# Altium footprint library Package_SO.PcbLib: 333 footprints (part 3 of 21)
Each footprint in its own frame and in the unit in brackets; x right, y up, seen from the top. Pads: shape width x height; smd on the part's side, far side on the other; paste and mask are expansions set on the pad; w line width, h text height; cw(c..) or ccw(c..) is an arc to the next point about the centre after c.
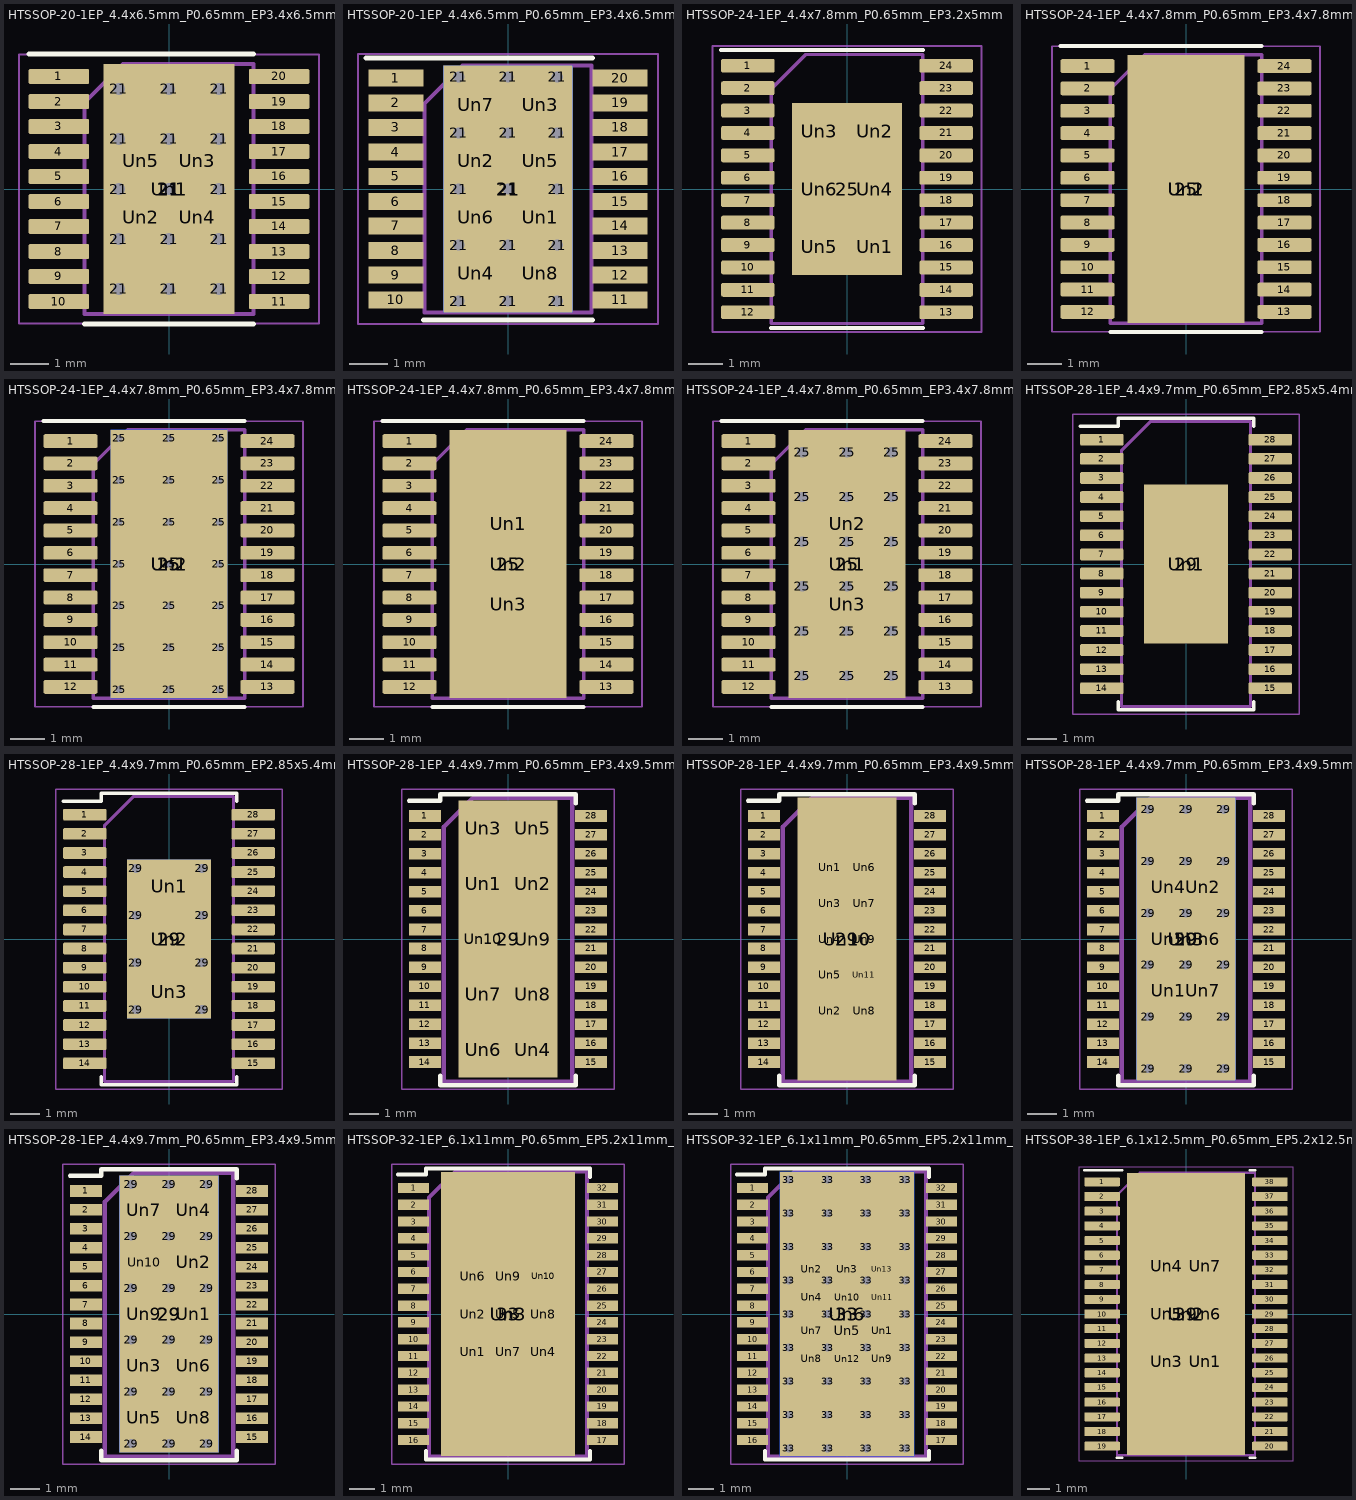
[diagram p2: the footprints below, top view; thin cyan lines are the x and y axes]

## HTSSOP-20-1EP_4.4x6.5mm_P0.65mm_EP3.4x6.5mm_Mask2.96x2.96mm_ThermalVias [mm]
pads (42):
  rrect25% 1.575x0.4 smd: 1(-2.863,2.925) 2(-2.863,2.275) 3(-2.863,1.625) 4(-2.863,0.975) 5(-2.863,0.325) 6(-2.863,-0.325) 7(-2.863,-0.975) 8(-2.863,-1.625) 9(-2.863,-2.275) 10(-2.863,-2.925) 11(2.863,-2.925) 12(2.863,-2.275) 13(2.863,-1.625) 14(2.863,-0.975) 15(2.863,-0.325) 16(2.863,0.325) 17(2.863,0.975) 18(2.863,1.625) 19(2.863,2.275) 20(2.863,2.925)
  round 0.6 hole 0.3: 21(-1.3,-2.6) 21(-1.3,-1.3) 21(-1.3,0) 21(-1.3,1.3) 21(-1.3,2.6) 21(0,-2.6) 21(0,-1.3) 21(0,0) 21(0,1.3) 21(0,2.6) 21(1.3,-2.6) 21(1.3,-1.3) 21(1.3,0) 21(1.3,1.3) 21(1.3,2.6)
  rect 3.4x6.5 smd: 21(0,0)
  rect 3.2x5.8 smd far side: 21(0,0)
  rect 2.96x2.96 on Top Solder: Un1(0,0)
  rrect21% 1.19x1.19 on Top Paste: Un2(-0.74,-0.74) Un3(0.74,0.74) Un4(0.74,-0.74) Un5(-0.74,0.74)
F.SilkS:
  lines w0.12: -3.65,3.51 0,3.51 2.2,3.51 ; -2.2,-3.51 0,-3.51 2.2,-3.51
F.CrtYd:
  lines w0.05: -3.9,-3.5 -3.9,3.5 3.9,3.5 3.9,-3.5 -3.9,-3.5
F.Fab:
  lines w0.1: -2.2,-3.25 -2.2,2.25 -1.2,3.25 2.2,3.25 2.2,-3.25 -2.2,-3.25
  text "'.Designator'" at -4.047,-0.84 h1

## HTSSOP-20-1EP_4.4x6.5mm_P0.65mm_EP3.4x6.5mm_ThermalVias [mm]
pads (45):
  rect 1.45x0.45 smd: 1(-2.95,2.92) 2(-2.95,2.27) 3(-2.95,1.62) 4(-2.95,0.97) 5(-2.95,0.33) 6(-2.95,-0.33) 7(-2.95,-0.97) 8(-2.95,-1.62) 9(-2.95,-2.27) 10(-2.95,-2.92) 11(2.95,-2.92) 12(2.95,-2.27) 13(2.95,-1.62) 14(2.95,-0.97) 15(2.95,-0.33) 16(2.95,0.33) 17(2.95,0.97) 18(2.95,1.62) 19(2.95,2.27) 20(2.95,2.92)
  round 0.6 hole 0.3: 21(-1.3,-2.95) 21(-1.3,-1.475) 21(-1.3,0) 21(-1.3,1.475) 21(-1.3,2.95) 21(0,-2.95) 21(0,-1.475) 21(0,0) 21(0,1.475) 21(0,2.95) 21(1.3,-2.95) 21(1.3,-1.475) 21(1.3,0) 21(1.3,1.475) 21(1.3,2.95)
  rect 3.4x6.5 smd far side: 21(0,0)
  rect 3.4x6.5 smd: 21(0,0)
  rect 1.4x1.075 on Top Paste: Un1(0.85,-0.737) Un2(-0.85,0.737) Un3(0.85,2.213) Un4(-0.85,-2.213) Un5(0.85,0.737) Un6(-0.85,-0.737) Un7(-0.85,2.213) Un8(0.85,-2.213)
F.SilkS:
  lines w0.12: -3.75,3.45 2.23,3.45 ; -2.23,-3.45 2.23,-3.45
F.CrtYd:
  lines w0.05: -3.95,-3.55 3.95,-3.55 3.95,3.55 -3.95,3.55 -3.95,-3.55
F.Fab:
  lines w0.1: -2.2,-3.25 -2.2,2.25 -1.2,3.25 2.2,3.25 2.2,-3.25 -2.2,-3.25
  text "'.Designator'" at -3.267,-0.702 h0.8

## HTSSOP-24-1EP_4.4x7.8mm_P0.65mm_EP3.2x5mm [mm]
pads (31):
  rrect25% 1.55x0.4 smd: 1(-2.875,3.575) 2(-2.875,2.925) 3(-2.875,2.275) 4(-2.875,1.625) 5(-2.875,0.975) 6(-2.875,0.325) 7(-2.875,-0.325) 8(-2.875,-0.975) 9(-2.875,-1.625) 10(-2.875,-2.275) 11(-2.875,-2.925) 12(-2.875,-3.575) 13(2.875,-3.575) 14(2.875,-2.925) 15(2.875,-2.275) 16(2.875,-1.625) 17(2.875,-0.975) 18(2.875,-0.325) 19(2.875,0.325) 20(2.875,0.975) 21(2.875,1.625) 22(2.875,2.275) 23(2.875,2.925) 24(2.875,3.575)
  rect 3.2x5 smd: 25(0,0)
  rrect19% 1.29x1.34 on Top Paste: Un1(0.8,-1.67) Un2(0.8,1.67) Un3(-0.8,1.67) Un4(0.8,0) Un5(-0.8,-1.67) Un6(-0.8,0)
F.SilkS:
  lines w0.12: -3.65,4.035 0,4.035 2.2,4.035 ; -2.2,-4.035 0,-4.035 2.2,-4.035
F.CrtYd:
  lines w0.05: -3.9,-4.15 -3.9,4.15 3.9,4.15 3.9,-4.15 -3.9,-4.15
F.Fab:
  lines w0.1: -2.2,-3.9 2.2,-3.9 2.2,3.9 -1.2,3.9 -2.2,2.9 -2.2,-3.9
  text "'.Designator'" at -4.047,-0.84 h1

## HTSSOP-24-1EP_4.4x7.8mm_P0.65mm_EP3.4x7.8mm_Mask2.4x2.98mm [mm]
pads (27):
  rrect25% 1.575x0.4 smd: 1(-2.863,3.575) 2(-2.863,2.925) 3(-2.863,2.275) 4(-2.863,1.625) 5(-2.863,0.975) 6(-2.863,0.325) 7(-2.863,-0.325) 8(-2.863,-0.975) 9(-2.863,-1.625) 10(-2.863,-2.275) 11(-2.863,-2.925) 12(-2.863,-3.575) 13(2.863,-3.575) 14(2.863,-2.925) 15(2.863,-2.275) 16(2.863,-1.625) 17(2.863,-0.975) 18(2.863,-0.325) 19(2.863,0.325) 20(2.863,0.975) 21(2.863,1.625) 22(2.863,2.275) 23(2.863,2.925) 24(2.863,3.575)
  rect 3.4x7.8 smd: 25(0,0)
  rect 2.4x2.98 on Top Solder: Un1(0,0)
  rrect13% 1.93x2.4 on Top Paste: Un2(0,0)
F.SilkS:
  lines w0.12: -3.65,4.16 0,4.16 2.2,4.16 ; -2.2,-4.16 0,-4.16 2.2,-4.16
F.CrtYd:
  lines w0.05: -3.9,-4.15 -3.9,4.15 3.9,4.15 3.9,-4.15 -3.9,-4.15
F.Fab:
  lines w0.1: -2.2,-3.9 2.2,-3.9 2.2,3.9 -1.2,3.9 -2.2,2.9 -2.2,-3.9
  text "'.Designator'" at -4.047,-0.84 h1

## HTSSOP-24-1EP_4.4x7.8mm_P0.65mm_EP3.4x7.8mm_Mask2.4x2.98mm_ThermalVias [mm]
pads (49):
  rrect25% 1.575x0.4 smd: 1(-2.863,3.575) 2(-2.863,2.925) 3(-2.863,2.275) 4(-2.863,1.625) 5(-2.863,0.975) 6(-2.863,0.325) 7(-2.863,-0.325) 8(-2.863,-0.975) 9(-2.863,-1.625) 10(-2.863,-2.275) 11(-2.863,-2.925) 12(-2.863,-3.575) 13(2.863,-3.575) 14(2.863,-2.925) 15(2.863,-2.275) 16(2.863,-1.625) 17(2.863,-0.975) 18(2.863,-0.325) 19(2.863,0.325) 20(2.863,0.975) 21(2.863,1.625) 22(2.863,2.275) 23(2.863,2.925) 24(2.863,3.575)
  round 0.5 hole 0.2: 25(-1.45,-3.65) 25(-1.45,-2.433) 25(-1.45,-1.217) 25(-1.45,0) 25(-1.45,1.217) 25(-1.45,2.433) 25(-1.45,3.65) 25(0,-3.65) 25(0,-2.433) 25(0,-1.217) 25(0,0) 25(0,1.217) 25(0,2.433) 25(0,3.65) 25(1.45,-3.65) 25(1.45,-2.433) 25(1.45,-1.217) 25(1.45,0) 25(1.45,1.217) 25(1.45,2.433) 25(1.45,3.65)
  rect 3.4x7.8 smd: 25(0,0)
  rect 3.4x7.8 smd far side: 25(0,0)
  rect 2.4x2.98 on Top Solder: Un1(0,0)
  rrect13% 1.93x2.4 on Top Paste: Un2(0,0)
F.SilkS:
  lines w0.12: -3.65,4.16 0,4.16 2.2,4.16 ; -2.2,-4.16 0,-4.16 2.2,-4.16
F.CrtYd:
  lines w0.05: -3.9,-4.15 -3.9,4.15 3.9,4.15 3.9,-4.15 -3.9,-4.15
F.Fab:
  lines w0.1: -2.2,-3.9 2.2,-3.9 2.2,3.9 -1.2,3.9 -2.2,2.9 -2.2,-3.9
  text "'.Designator'" at -4.047,-0.84 h1

## HTSSOP-24-1EP_4.4x7.8mm_P0.65mm_EP3.4x7.8mm_Mask2.4x4.68mm [mm]
pads (28):
  rrect25% 1.575x0.4 smd: 1(-2.863,3.575) 2(-2.863,2.925) 3(-2.863,2.275) 4(-2.863,1.625) 5(-2.863,0.975) 6(-2.863,0.325) 7(-2.863,-0.325) 8(-2.863,-0.975) 9(-2.863,-1.625) 10(-2.863,-2.275) 11(-2.863,-2.925) 12(-2.863,-3.575) 13(2.863,-3.575) 14(2.863,-2.925) 15(2.863,-2.275) 16(2.863,-1.625) 17(2.863,-0.975) 18(2.863,-0.325) 19(2.863,0.325) 20(2.863,0.975) 21(2.863,1.625) 22(2.863,2.275) 23(2.863,2.925) 24(2.863,3.575)
  rect 3.4x7.8 smd: 25(0,0)
  rrect13% 1.93x1.89 on Top Paste: Un1(0,1.17) Un3(0,-1.17)
  rect 2.4x4.68 on Top Solder: Un2(0,0)
F.SilkS:
  lines w0.12: -3.65,4.16 0,4.16 2.2,4.16 ; -2.2,-4.16 0,-4.16 2.2,-4.16
F.CrtYd:
  lines w0.05: -3.9,-4.15 -3.9,4.15 3.9,4.15 3.9,-4.15 -3.9,-4.15
F.Fab:
  lines w0.1: -2.2,-3.9 -2.2,2.9 -1.2,3.9 2.2,3.9 2.2,-3.9 -2.2,-3.9
  text "'.Designator'" at -4.047,-0.84 h1

## HTSSOP-24-1EP_4.4x7.8mm_P0.65mm_EP3.4x7.8mm_Mask2.4x4.68mm_ThermalVias [mm]
pads (47):
  rrect25% 1.575x0.4 smd: 1(-2.863,3.575) 2(-2.863,2.925) 3(-2.863,2.275) 4(-2.863,1.625) 5(-2.863,0.975) 6(-2.863,0.325) 7(-2.863,-0.325) 8(-2.863,-0.975) 9(-2.863,-1.625) 10(-2.863,-2.275) 11(-2.863,-2.925) 12(-2.863,-3.575) 13(2.863,-3.575) 14(2.863,-2.925) 15(2.863,-2.275) 16(2.863,-1.625) 17(2.863,-0.975) 18(2.863,-0.325) 19(2.863,0.325) 20(2.863,0.975) 21(2.863,1.625) 22(2.863,2.275) 23(2.863,2.925) 24(2.863,3.575)
  round 0.6 hole 0.3: 25(-1.3,-3.25) 25(-1.3,-1.95) 25(-1.3,-0.65) 25(-1.3,0.65) 25(-1.3,1.95) 25(-1.3,3.25) 25(0,-3.25) 25(0,-1.95) 25(0,-0.65) 25(0,0.65) 25(0,1.95) 25(0,3.25) 25(1.3,-3.25) 25(1.3,-1.95) 25(1.3,-0.65) 25(1.3,0.65) 25(1.3,1.95) 25(1.3,3.25)
  rect 3.2x7.1 smd far side: 25(0,0)
  rect 3.4x7.8 smd: 25(0,0)
  rect 2.4x4.68 on Top Solder: Un1(0,0)
  rrect13% 1.93x1.89 on Top Paste: Un2(0,1.17) Un3(0,-1.17)
F.SilkS:
  lines w0.12: -3.65,4.16 0,4.16 2.2,4.16 ; -2.2,-4.16 0,-4.16 2.2,-4.16
F.CrtYd:
  lines w0.05: -3.9,-4.15 -3.9,4.15 3.9,4.15 3.9,-4.15 -3.9,-4.15
F.Fab:
  lines w0.1: -2.2,-3.9 2.2,-3.9 2.2,3.9 -1.2,3.9 -2.2,2.9 -2.2,-3.9
  text "'.Designator'" at -4.047,-0.84 h1

## HTSSOP-28-1EP_4.4x9.7mm_P0.65mm_EP2.85x5.4mm [mm]
pads (30):
  rrect25% 1.475x0.4 smd: 1(-2.863,4.225) 2(-2.863,3.575) 3(-2.863,2.925) 4(-2.863,2.275) 5(-2.863,1.625) 6(-2.863,0.975) 7(-2.863,0.325) 8(-2.863,-0.325) 9(-2.863,-0.975) 10(-2.863,-1.625) 11(-2.863,-2.275) 12(-2.863,-2.925) 13(-2.863,-3.575) 14(-2.863,-4.225) 15(2.863,-4.225) 16(2.863,-3.575) 17(2.863,-2.925) 18(2.863,-2.275) 19(2.863,-1.625) 20(2.863,-0.975) 21(2.863,-0.325) 22(2.863,0.325) 23(2.863,0.975) 24(2.863,1.625) 25(2.863,2.275) 26(2.863,2.925) 27(2.863,3.575) 28(2.863,4.225)
  rect 2.85x5.4 smd: 29(0,0)
  rrect11% 2.3x4.35 on Top Paste: Un1(0,0)
F.SilkS:
  lines w0.12: -3.6,4.685 -2.31,4.685 -2.31,4.96 0,4.96 2.31,4.96 2.31,4.685 ; -2.31,-4.685 -2.31,-4.96 0,-4.96 2.31,-4.96 2.31,-4.685
F.CrtYd:
  lines w0.05: -3.85,-5.1 3.85,-5.1 3.85,5.1 -3.85,5.1 -3.85,-5.1
F.Fab:
  lines w0.1: -2.2,-4.85 2.2,-4.85 2.2,4.85 -1.2,4.85 -2.2,3.85 -2.2,-4.85
  text "'.Designator'" at -4.047,-0.84 h1

## HTSSOP-28-1EP_4.4x9.7mm_P0.65mm_EP2.85x5.4mm_ThermalVias [mm]
pads (41):
  rrect25% 1.475x0.4 smd: 1(-2.863,4.225) 2(-2.863,3.575) 3(-2.863,2.925) 4(-2.863,2.275) 5(-2.863,1.625) 6(-2.863,0.975) 7(-2.863,0.325) 8(-2.863,-0.325) 9(-2.863,-0.975) 10(-2.863,-1.625) 11(-2.863,-2.275) 12(-2.863,-2.925) 13(-2.863,-3.575) 14(-2.863,-4.225) 15(2.863,-4.225) 16(2.863,-3.575) 17(2.863,-2.925) 18(2.863,-2.275) 19(2.863,-1.625) 20(2.863,-0.975) 21(2.863,-0.325) 22(2.863,0.325) 23(2.863,0.975) 24(2.863,1.625) 25(2.863,2.275) 26(2.863,2.925) 27(2.863,3.575) 28(2.863,4.225)
  round 0.6 hole 0.3: 29(-1.125,-2.4) 29(-1.125,-0.8) 29(-1.125,0.8) 29(-1.125,2.4) 29(1.125,-2.4) 29(1.125,-0.8) 29(1.125,0.8) 29(1.125,2.4)
  rect 2.85x5.4 smd: 29(0,0)
  rect 2.85x5.4 smd far side: 29(0,0)
  rrect17% 2.3x1.45 on Top Paste: Un1(0,1.8) Un2(0,0) Un3(0,-1.8)
F.SilkS:
  lines w0.12: -3.6,4.685 -2.31,4.685 -2.31,4.96 0,4.96 2.31,4.96 2.31,4.685 ; -2.31,-4.685 -2.31,-4.96 0,-4.96 2.31,-4.96 2.31,-4.685
F.CrtYd:
  lines w0.05: -3.85,-5.1 -3.85,5.1 3.85,5.1 3.85,-5.1 -3.85,-5.1
F.Fab:
  lines w0.1: -2.2,-4.85 -2.2,3.85 -1.2,4.85 2.2,4.85 2.2,-4.85 -2.2,-4.85
  text "'.Designator'" at -4.047,-0.84 h1

## HTSSOP-28-1EP_4.4x9.7mm_P0.65mm_EP3.4x9.5mm [mm]
pads (39):
  rect 1.1x0.4 smd: 1(-2.85,4.225) 2(-2.85,3.575) 3(-2.85,2.925) 4(-2.85,2.275) 5(-2.85,1.625) 6(-2.85,0.975) 7(-2.85,0.325) 8(-2.85,-0.325) 9(-2.85,-0.975) 10(-2.85,-1.625) 11(-2.85,-2.275) 12(-2.85,-2.925) 13(-2.85,-3.575) 14(-2.85,-4.225) 15(2.85,-4.225) 16(2.85,-3.575) 17(2.85,-2.925) 18(2.85,-2.275) 19(2.85,-1.625) 20(2.85,-0.975) 21(2.85,-0.325) 22(2.85,0.325) 23(2.85,0.975) 24(2.85,1.625) 25(2.85,2.275) 26(2.85,2.925) 27(2.85,3.575) 28(2.85,4.225)
  rect 3.4x9.5 smd: 29(0,0)
  rect 1.4x1.6 on Top Paste: Un1(-0.85,1.9) Un2(0.85,1.9) Un3(-0.85,3.8) Un4(0.85,-3.8) Un5(0.85,3.8) Un6(-0.85,-3.8) Un7(-0.85,-1.9) Un8(0.85,-1.9) Un9(0.85,0) Un10(-0.85,0)
F.SilkS:
  lines w0.15: -3.4,4.75 -2.325,4.75 -2.325,4.975 2.325,4.975 2.325,4.65 ; -2.325,-4.701 -2.325,-5.026 2.325,-5.026 2.325,-4.701
F.CrtYd:
  lines w0.05: -3.65,-5.15 -3.65,5.15 3.65,5.15 3.65,-5.15 -3.65,-5.15
F.Fab:
  lines w0.15: -2.2,-4.901 2.2,-4.901 ; -2.2,-4.85 -2.2,3.85 -1.2,4.85 2.2,4.85 2.2,-4.85
  text "'.Designator'" at -3.267,-0.702 h0.8

## HTSSOP-28-1EP_4.4x9.7mm_P0.65mm_EP3.4x9.5mm_Mask2.4x6.17mm [mm]
pads (40):
  rect 1.1x0.4 smd: 1(-2.85,4.225) 2(-2.85,3.575) 3(-2.85,2.925) 4(-2.85,2.275) 5(-2.85,1.625) 6(-2.85,0.975) 7(-2.85,0.325) 8(-2.85,-0.325) 9(-2.85,-0.975) 10(-2.85,-1.625) 11(-2.85,-2.275) 12(-2.85,-2.925) 13(-2.85,-3.575) 14(-2.85,-4.225) 15(2.85,-4.225) 16(2.85,-3.575) 17(2.85,-2.925) 18(2.85,-2.275) 19(2.85,-1.625) 20(2.85,-0.975) 21(2.85,-0.325) 22(2.85,0.325) 23(2.85,0.975) 24(2.85,1.625) 25(2.85,2.275) 26(2.85,2.925) 27(2.85,3.575) 28(2.85,4.225)
  rect 3.4x9.7 smd: 29(0,0)
  rect 0.9x0.93 on Top Paste: Un1(-0.6,2.468) Un2(-0.6,-2.468) Un3(-0.6,1.234) Un4(-0.6,0) Un5(-0.6,-1.234) Un6(0.6,2.468) Un7(0.6,1.234) Un8(0.6,-2.468) Un9(0.6,0) Un11(0.6,-1.234)
  rect 2.4x6.17 on Top Solder: Un10(0,0)
F.SilkS:
  lines w0.15: -3.4,4.75 -2.325,4.75 -2.325,4.975 2.325,4.975 2.325,4.65 ; -2.325,-4.701 -2.325,-5.026 2.325,-5.026 2.325,-4.701
F.CrtYd:
  lines w0.05: -3.65,-5.15 -3.65,5.15 3.65,5.15 3.65,-5.15 -3.65,-5.15
F.Fab:
  lines w0.15: -2.2,-4.901 2.2,-4.901 ; -2.2,-4.85 -2.2,3.85 -1.2,4.85 2.2,4.85 2.2,-4.85
  text "'.Designator'" at -3.267,-0.702 h0.8

## HTSSOP-28-1EP_4.4x9.7mm_P0.65mm_EP3.4x9.5mm_Mask2.4x6.17mm_ThermalVias [mm]
pads (55):
  rect 1.1x0.4 smd: 1(-2.85,4.225) 2(-2.85,3.575) 3(-2.85,2.925) 4(-2.85,2.275) 5(-2.85,1.625) 6(-2.85,0.975) 7(-2.85,0.325) 8(-2.85,-0.325) 9(-2.85,-0.975) 10(-2.85,-1.625) 11(-2.85,-2.275) 12(-2.85,-2.925) 13(-2.85,-3.575) 14(-2.85,-4.225) 15(2.85,-4.225) 16(2.85,-3.575) 17(2.85,-2.925) 18(2.85,-2.275) 19(2.85,-1.625) 20(2.85,-0.975) 21(2.85,-0.325) 22(2.85,0.325) 23(2.85,0.975) 24(2.85,1.625) 25(2.85,2.275) 26(2.85,2.925) 27(2.85,3.575) 28(2.85,4.225)
  round 0.6 hole 0.3: 29(-1.3,-4.45) 29(-1.3,-2.67) 29(-1.3,-0.89) 29(-1.3,0.89) 29(-1.3,2.67) 29(-1.3,4.45) 29(0,-4.45) 29(0,-2.67) 29(0,-0.89) 29(0,0.89) 29(0,2.67) 29(0,4.45) 29(1.3,-4.45) 29(1.3,-2.67) 29(1.3,-0.89) 29(1.3,0.89) 29(1.3,2.67) 29(1.3,4.45)
  rect 3.4x9.7 smd: 29(0,0)
  rect 3.4x9.7 smd far side: 29(0,0)
  rect 0.9x1.4 on Top Paste: Un1(-0.6,-1.78) Un2(0.6,1.78) Un4(-0.6,1.78) Un5(-0.6,0) Un6(0.6,0) Un7(0.6,-1.78)
  rect 2.4x6.17 on Top Solder: Un3(0,0)
F.SilkS:
  lines w0.15: -3.4,4.75 -2.325,4.75 -2.325,4.975 2.325,4.975 2.325,4.65 ; -2.325,-4.701 -2.325,-5.026 2.325,-5.026 2.325,-4.701
F.CrtYd:
  lines w0.05: -3.65,-5.15 -3.65,5.15 3.65,5.15 3.65,-5.15 -3.65,-5.15
F.Fab:
  lines w0.15: -2.2,-4.901 2.2,-4.901 ; -2.2,-4.85 -2.2,3.85 -1.2,4.85 2.2,4.85 2.2,-4.85
  text "'.Designator'" at -3.267,-0.702 h0.8

## HTSSOP-28-1EP_4.4x9.7mm_P0.65mm_EP3.4x9.5mm_ThermalVias [mm]
pads (58):
  rect 1.1x0.4 smd: 1(-2.85,4.225) 2(-2.85,3.575) 3(-2.85,2.925) 4(-2.85,2.275) 5(-2.85,1.625) 6(-2.85,0.975) 7(-2.85,0.325) 8(-2.85,-0.325) 9(-2.85,-0.975) 10(-2.85,-1.625) 11(-2.85,-2.275) 12(-2.85,-2.925) 13(-2.85,-3.575) 14(-2.85,-4.225) 15(2.85,-4.225) 16(2.85,-3.575) 17(2.85,-2.925) 18(2.85,-2.275) 19(2.85,-1.625) 20(2.85,-0.975) 21(2.85,-0.325) 22(2.85,0.325) 23(2.85,0.975) 24(2.85,1.625) 25(2.85,2.275) 26(2.85,2.925) 27(2.85,3.575) 28(2.85,4.225)
  round 0.6 hole 0.3: 29(-1.3,-4.45) 29(-1.3,-2.67) 29(-1.3,-0.89) 29(-1.3,0.89) 29(-1.3,2.67) 29(-1.3,4.45) 29(0,-4.45) 29(0,-2.67) 29(0,-0.89) 29(0,0.89) 29(0,2.67) 29(0,4.45) 29(1.3,-4.45) 29(1.3,-2.67) 29(1.3,-0.89) 29(1.3,0.89) 29(1.3,2.67) 29(1.3,4.45)
  rect 3.4x9.5 smd: 29(0,0)
  rect 3.4x9.5 smd far side: 29(0,0)
  rect 1.4x1.4 on Top Paste: Un1(0.85,0) Un2(0.85,1.78) Un3(-0.85,-1.78) Un4(0.85,3.56) Un5(-0.85,-3.56) Un6(0.85,-1.78) Un7(-0.85,3.56) Un8(0.85,-3.56) Un9(-0.85,0) Un10(-0.85,1.78)
F.SilkS:
  lines w0.15: -3.4,4.75 -2.325,4.75 -2.325,4.975 2.325,4.975 2.325,4.65 ; -2.325,-4.701 -2.325,-5.026 2.325,-5.026 2.325,-4.701
F.CrtYd:
  lines w0.05: -3.65,-5.15 3.65,-5.15 3.65,5.15 -3.65,5.15 -3.65,-5.15
F.Fab:
  lines w0.15: -2.2,-4.901 2.2,-4.901 ; -2.2,-4.85 -2.2,3.85 -1.2,4.85 2.2,4.85 2.2,-4.85
  text "'.Designator'" at -3.267,-0.702 h0.8

## HTSSOP-32-1EP_6.1x11mm_P0.65mm_EP5.2x11mm_Mask4.11x4.36mm [mm]
pads (43):
  rect 1.2x0.4 smd: 1(-3.65,4.875) 2(-3.65,4.225) 3(-3.65,3.575) 4(-3.65,2.925) 5(-3.65,2.275) 6(-3.65,1.625) 7(-3.65,0.975) 8(-3.65,0.325) 9(-3.65,-0.325) 10(-3.65,-0.975) 11(-3.65,-1.625) 12(-3.65,-2.275) 13(-3.65,-2.925) 14(-3.65,-3.575) 15(-3.65,-4.225) 16(-3.65,-4.875) 17(3.65,-4.875) 18(3.65,-4.225) 19(3.65,-3.575) 20(3.65,-2.925) 21(3.65,-2.275) 22(3.65,-1.625) 23(3.65,-0.975) 24(3.65,-0.325) 25(3.65,0.325) 26(3.65,0.975) 27(3.65,1.625) 28(3.65,2.275) 29(3.65,2.925) 30(3.65,3.575) 31(3.65,4.225) 32(3.65,4.875)
  rect 5.2x11 smd: 33(0,0)
  rect 1.07x1.16 on Top Paste: Un1(-1.37,-1.46) Un2(-1.37,0) Un4(1.37,-1.46) Un5(0,0) Un6(-1.37,1.46) Un7(0,-1.46) Un8(1.37,0) Un9(0,1.46) Un10(1.37,1.46)
  rect 4.11x4.36 on Top Solder: Un3(0,0)
F.SilkS:
  lines w0.15: -4.25,5.4 -3.175,5.4 -3.175,5.625 3.175,5.625 3.175,5.3 ; -3.175,-5.3 -3.175,-5.625 3.175,-5.625 3.175,-5.3
F.CrtYd:
  lines w0.05: -4.5,-5.8 -4.5,5.8 4.5,5.8 4.5,-5.8 -4.5,-5.8
F.Fab:
  lines w0.15: -3.05,-5.5 3.05,-5.5 3.05,5.5 -2.05,5.5 -3.05,4.5 -3.05,-5.5
  text "'.Designator'" at -3.267,-0.702 h0.8

## HTSSOP-32-1EP_6.1x11mm_P0.65mm_EP5.2x11mm_Mask4.11x4.36mm_ThermalVias [mm]
pads (83):
  rect 1.2x0.4 smd: 1(-3.65,4.875) 2(-3.65,4.225) 3(-3.65,3.575) 4(-3.65,2.925) 5(-3.65,2.275) 6(-3.65,1.625) 7(-3.65,0.975) 8(-3.65,0.325) 9(-3.65,-0.325) 10(-3.65,-0.975) 11(-3.65,-1.625) 12(-3.65,-2.275) 13(-3.65,-2.925) 14(-3.65,-3.575) 15(-3.65,-4.225) 16(-3.65,-4.875) 17(3.65,-4.875) 18(3.65,-4.225) 19(3.65,-3.575) 20(3.65,-2.925) 21(3.65,-2.275) 22(3.65,-1.625) 23(3.65,-0.975) 24(3.65,-0.325) 25(3.65,0.325) 26(3.65,0.975) 27(3.65,1.625) 28(3.65,2.275) 29(3.65,2.925) 30(3.65,3.575) 31(3.65,4.225) 32(3.65,4.875)
  round 0.6 hole 0.3: 33(-2.25,-5.2) 33(-2.25,-3.9) 33(-2.25,-2.6) 33(-2.25,-1.3) 33(-2.25,0) 33(-2.25,1.3) 33(-2.25,2.6) 33(-2.25,3.9) 33(-2.25,5.2) 33(-0.75,-5.2) 33(-0.75,-3.9) 33(-0.75,-2.6) 33(-0.75,-1.3) 33(-0.75,0) 33(-0.75,1.3) 33(-0.75,2.6) 33(-0.75,3.9) 33(-0.75,5.2) 33(0.75,-5.2) 33(0.75,-3.9) 33(0.75,-2.6) 33(0.75,-1.3) 33(0.75,0) 33(0.75,1.3) 33(0.75,2.6) 33(0.75,3.9) 33(0.75,5.2) 33(2.25,-5.2) 33(2.25,-3.9) 33(2.25,-2.6) 33(2.25,-1.3) 33(2.25,0) 33(2.25,1.3) 33(2.25,2.6) 33(2.25,3.9) 33(2.25,5.2)
  rect 5.2x11 smd: 33(0,0)
  rect 5.2x11 smd far side: 33(0,0)
  rect 0.93x1 on Top Paste: Un1(1.365,-0.65) Un4(-1.365,0.65) Un7(-1.365,-0.65) Un11(1.365,0.65)
  rect 0.93x0.55 on Top Paste: Un2(-1.365,1.725) Un8(-1.365,-1.725) Un9(1.365,-1.725) Un13(1.365,1.725)
  rect 1.2x0.55 on Top Paste: Un3(0,1.725) Un12(0,-1.725)
  rect 1.2x1 on Top Paste: Un5(0,-0.65) Un10(0,0.65)
  rect 4.11x4.36 on Top Solder: Un6(0,0)
F.SilkS:
  lines w0.15: -4.25,5.4 -3.175,5.4 -3.175,5.625 3.175,5.625 3.175,5.3 ; -3.175,-5.3 -3.175,-5.625 3.175,-5.625 3.175,-5.3
F.CrtYd:
  lines w0.05: -4.5,-5.8 4.5,-5.8 4.5,5.8 -4.5,5.8 -4.5,-5.8
F.Fab:
  lines w0.15: -3.05,-5.5 3.05,-5.5 3.05,5.5 -2.05,5.5 -3.05,4.5 -3.05,-5.5
  text "'.Designator'" at -3.267,-0.702 h0.8

## HTSSOP-38-1EP_6.1x12.5mm_P0.65mm_EP5.2x12.5mm_Mask3.39x6.35mm [mm]
pads (46):
  rrect25% 1.575x0.4 smd: 1(-3.712,5.85) 2(-3.712,5.2) 3(-3.712,4.55) 4(-3.712,3.9) 5(-3.712,3.25) 6(-3.712,2.6) 7(-3.712,1.95) 8(-3.712,1.3) 9(-3.712,0.65) 10(-3.712,0) 11(-3.712,-0.65) 12(-3.712,-1.3) 13(-3.712,-1.95) 14(-3.712,-2.6) 15(-3.712,-3.25) 16(-3.712,-3.9) 17(-3.712,-4.55) 18(-3.712,-5.2) 19(-3.712,-5.85) 20(3.712,-5.85) 21(3.712,-5.2) 22(3.712,-4.55) 23(3.712,-3.9) 24(3.712,-3.25) 25(3.712,-2.6) 26(3.712,-1.95) 27(3.712,-1.3) 28(3.712,-0.65) 29(3.712,0) 30(3.712,0.65) 31(3.712,1.3) 32(3.712,1.95) 33(3.712,2.6) 34(3.712,3.25) 35(3.712,3.9) 36(3.712,4.55) 37(3.712,5.2) 38(3.712,5.85)
  rect 5.2x12.5 smd: 39(0,0)
  rrect18% 1.37x1.71 on Top Paste: Un1(0.85,-2.12) Un3(-0.85,-2.12) Un4(-0.85,2.12) Un5(-0.85,0) Un6(0.85,0) Un7(0.85,2.12)
  rect 3.39x6.35 on Top Solder: Un2(0,0)
F.SilkS:
  lines w0.12: -4.5,6.36 -2.836,6.36 ; -3.05,-6.36 -2.836,-6.36 ; 2.836,-6.36 3.05,-6.36 ; 2.836,6.36 3.05,6.36
F.CrtYd:
  lines w0.05: -4.75,-6.5 4.75,-6.5 4.75,6.5 -4.75,6.5 -4.75,-6.5
F.Fab:
  lines w0.1: -3.05,-6.25 3.05,-6.25 3.05,6.25 -2.05,6.25 -3.05,5.25 -3.05,-6.25
  text "'.Designator'" at -4.047,-0.84 h1